# Altium footprint library PcbLib1.PcbLib: 136 footprints (part 8 of 9)
Each footprint in its own frame and in the unit in brackets; x right, y up, seen from the top. Pads: shape width x height; smd on the part's side, far side on the other; paste and mask are expansions set on the pad; w line width, h text height; cw(c..) or ccw(c..) is an arc to the next point about the centre after c.
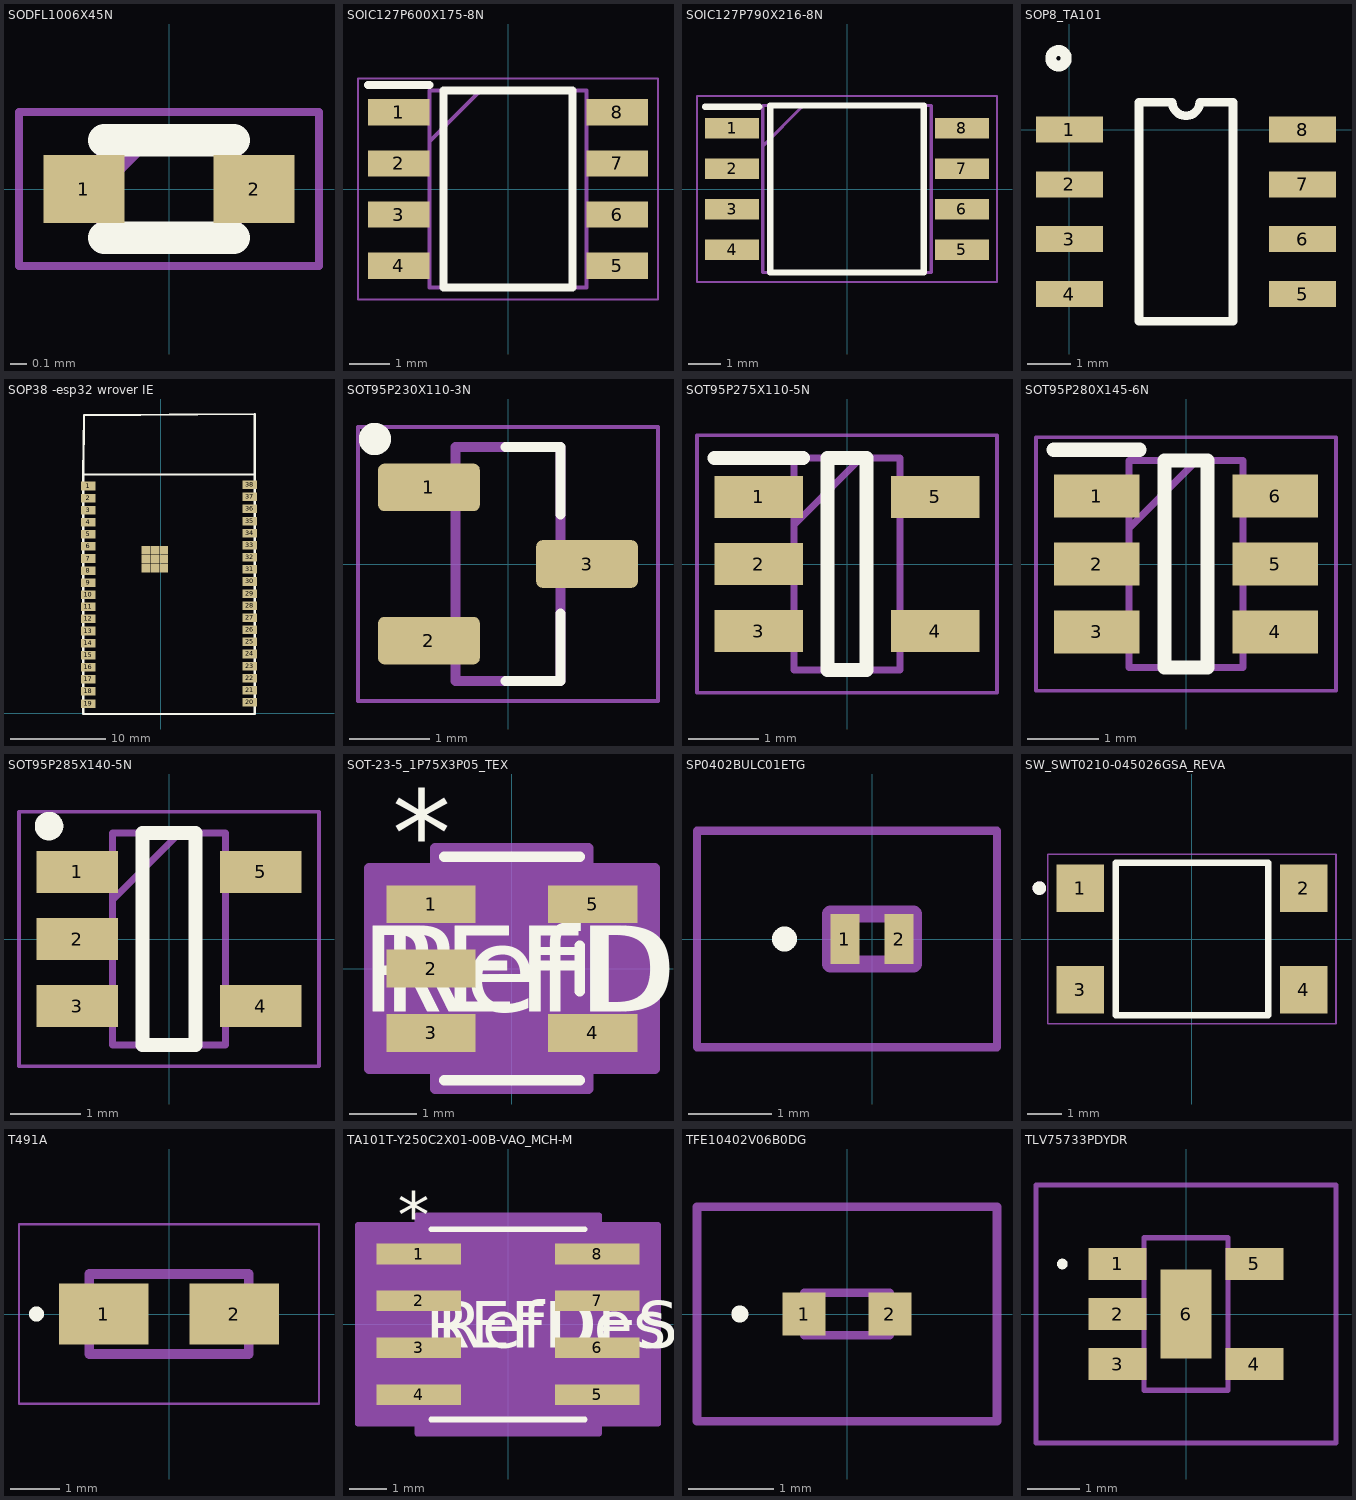
[diagram p7: the footprints below, top view; thin cyan lines are the x and y axes]

## SODFL1006X45N [mm]
pads (2):
  rect 0.5x0.42 smd: 1(-0.525,0) 2(0.525,0)
Top Overlay:
  lines w0.2: -0.4,-0.3 0.4,-0.3 ; -0.4,0.3 0.4,0.3
Mechanical 13:
  lines w0.1: -0.4,0.05 -0.15,0.3 ; -0.4,-0.3 -0.4,0.3 0.4,0.3 0.4,-0.3 -0.4,-0.3
Mechanical 15:
  lines w0.05: -0.925,-0.475 -0.925,0.475 0.925,0.475 0.925,-0.475 -0.925,-0.475
3D body "DF2S5.6FS,L3M.stp": height 0.4, standoff 0, extent -0.5,-0.3 0.5,0.3

## SOIC127P600X175-8N [mm]
pads (8):
  rect 1.525x0.65 smd: 1(-2.712,1.905) 2(-2.712,0.635) 3(-2.712,-0.635) 4(-2.712,-1.905) 5(2.712,-1.905) 6(2.712,-0.635) 7(2.712,0.635) 8(2.712,1.905)
Top Overlay:
  lines w0.2: -3.475,2.58 -1.95,2.58 ; -1.6,-2.45 -1.6,2.45 1.6,2.45 1.6,-2.45 -1.6,-2.45
Mechanical 13:
  lines w0.1: -1.95,1.18 -0.68,2.45 ; -1.95,-2.45 -1.95,2.45 1.95,2.45 1.95,-2.45 -1.95,-2.45
Mechanical 15:
  lines w0.05: -3.725,-2.75 -3.725,2.75 3.725,2.75 3.725,-2.75 -3.725,-2.75
3D body "NE555DR.stp": height 1.75, standoff 0, extent -3,-2.45 3,2.45

## SOIC127P790X216-8N [mm]
pads (8):
  rect 1.7x0.65 smd: 1(-3.6,1.905) 2(-3.6,0.635) 3(-3.6,-0.635) 4(-3.6,-1.905) 5(3.6,-1.905) 6(3.6,-0.635) 7(3.6,0.635) 8(3.6,1.905)
Top Overlay:
  lines w0.2: -4.45,2.58 -2.75,2.58 ; -2.4,-2.615 2.4,-2.615 2.4,2.615 -2.4,2.615 -2.4,-2.615
Mechanical 13:
  lines w0.1: -2.64,1.345 -1.37,2.615 ; -2.64,-2.615 2.64,-2.615 2.64,2.615 -2.64,2.615 -2.64,-2.615
Mechanical 15:
  lines w0.05: -4.7,-2.915 4.7,-2.915 4.7,2.915 -4.7,2.915 -4.7,-2.915
3D body "GD25Q128ESIGR.stp": height 2.16, standoff 0, extent -3.95,-2.615 3.95,2.615

## SOP8_TA101 [mm]
pads (8):
  rect 1.55x0.6 smd: 1(0,0) 2(0,-1.27) 3(0,-2.54) 4(0,-3.81) 5(5.4,-3.81) 6(5.4,-2.54) 7(5.4,-1.27) 8(5.4,0)
Top Overlay:
  circle w0.254: c-0.254,1.651 r0.18
  lines w0.2: 1.61,-4.445 1.61,0.635 2.382,0.635 ccw(c2.7,0.635) 3.017,0.635 3.79,0.635 3.79,-4.445 1.61,-4.445

## SOP38 -esp32 wrover IE [mm]
pads (47):
  rect 1.5x0.9 smd: 1(-7.62,23.876) 2(-7.62,22.606) 3(-7.62,21.336) 4(-7.62,20.066) 5(-7.62,18.796) 6(-7.62,17.526) 7(-7.62,16.256) 8(-7.62,14.986) 9(-7.62,13.716) 10(-7.62,12.446) 11(-7.62,11.176) 12(-7.62,9.906) 13(-7.62,8.636) 14(-7.62,7.366) 15(-7.62,6.096) 16(-7.62,4.826) 17(-7.62,3.556) 18(-7.62,2.286) 19(-7.62,1.016) 20(9.38,1.143) 21(9.38,2.413) 22(9.38,3.683) 23(9.38,4.953) 24(9.38,6.223) 25(9.372,7.493) 26(9.38,8.763) 27(9.38,10.033) 28(9.38,11.303) 29(9.38,12.573) 30(9.38,13.843) 31(9.38,15.113) 32(9.38,16.383) 33(9.38,17.653) 34(9.38,18.923) 35(9.38,20.193) 36(9.38,21.463) 37(9.38,22.733) 38(9.38,24.003)
  rect 0.9x0.9 smd: 38(-1.578,15.21) 38(-1.578,16.16) 38(-1.578,17.11) 38(-0.628,15.21) 38(-0.628,16.16) 38(-0.628,17.11) 38(0.322,15.21) 38(0.322,16.16) 38(0.322,17.11)
Top Overlay:
  lines w0.2: -8.12,-0.084 9.88,-0.084 ; -8.12,25.073 0.756,25.073 9.837,25.073
  lines w0.254: -8.12,-0.084 -8.12,1.016 -8.12,25.073 -8.054,31.316 9.88,31.443 9.88,1.143 9.88,-0.084
3D body "ESP32-WROVER-E-N4R8--3DModel-STEP-56544.STEP": height 3.45, standoff 0, extent -7.985,0.064 10.015,31.463

## SOT95P230X110-3N [mm]
pads (3):
  rrect25% 1.26x0.59 smd: 1(-0.98,0.95) 2(-0.98,-0.95) 3(0.98,0)
Top Overlay:
  circle w0.2: c-1.65,1.55 r0.1
  lines w0.127: -0.03,-1.45 0.65,-1.45 0.65,-0.615 ; -0.03,1.45 0.65,1.45 0.65,0.615
Mechanical 13:
  lines w0.127: -0.65,-1.45 -0.65,1.45 0.65,1.45 0.65,-1.45 -0.65,-1.45
Mechanical 15:
  lines w0.05: -1.86,-1.7 1.86,-1.7 1.86,1.7 -1.86,1.7 -1.86,-1.7
3D body "step_temp.STEP": height 1.1, standoff 0, extent -1.15,-1.45 1.15,1.45

## SOT95P275X110-5N [mm]
pads (5):
  rect 1.25x0.6 smd: 1(-1.25,0.95) 2(-1.25,0) 3(-1.25,-0.95) 4(1.25,-0.95) 5(1.25,0.95)
Top Overlay:
  lines w0.2: -1.875,1.5 -0.625,1.5 ; -0.275,-1.5 0.275,-1.5 0.275,1.5 -0.275,1.5 -0.275,-1.5
Top Courtyard:
  lines w0.05: -2.125,-1.825 2.125,-1.825 2.125,1.825 -2.125,1.825 -2.125,-1.825
Top 3D Body:
  lines w0.1: -0.75,0.55 0.2,1.5 ; -0.75,-1.5 0.75,-1.5 0.75,1.5 -0.75,1.5 -0.75,-1.5
3D body "NCV8114ASN180T1G.stp": height 1.1, standoff 0, extent -1.375,-1.5 1.375,1.5

## SOT95P280X145-6N [mm]
pads (6):
  rect 1.2x0.6 smd: 1(-1.25,0.95) 2(-1.25,0) 3(-1.25,-0.95) 4(1.25,-0.95) 5(1.25,0) 6(1.25,0.95)
Top Overlay:
  lines w0.2: -1.85,1.6 -0.65,1.6 ; -0.3,-1.45 0.3,-1.45 0.3,1.45 -0.3,1.45 -0.3,-1.45
Mechanical 13:
  lines w0.1: -0.8,0.5 0.15,1.45 ; -0.8,-1.45 0.8,-1.45 0.8,1.45 -0.8,1.45 -0.8,-1.45
Mechanical 15:
  lines w0.05: -2.1,-1.775 2.1,-1.775 2.1,1.775 -2.1,1.775 -2.1,-1.775
3D body "TLV61070ADBVR.stp": height 1.2, standoff 0, extent -1.4,-1.45 1.4,1.45

## SOT95P285X140-5N [mm]
pads (5):
  rect 1.15x0.6 smd: 1(-1.3,0.95) 2(-1.3,0) 3(-1.3,-0.95) 4(1.3,-0.95) 5(1.3,0.95)
Top Overlay:
  circle w0.254: c-1.7,1.6 r0.075
  lines w0.2: -0.375,-1.5 -0.375,1.5 0.375,1.5 0.375,-1.5 -0.375,-1.5
Top Courtyard:
  lines w0.05: -2.125,-1.8 -2.125,1.8 2.125,1.8 2.125,-1.8 -2.125,-1.8
Top 3D Body:
  lines w0.1: -0.8,0.55 0.15,1.5 ; -0.8,-1.5 -0.8,1.5 0.8,1.5 0.8,-1.5 -0.8,-1.5
3D body "AP7375-50W5-7.stp": height 1.4, standoff 0, extent -1.425,-1.5 1.425,1.5

## SOT-23-5_1P75X3P05_TEX [mil]
pads (5):
  rect 52x22 smd paste+0 mask+0: 1(-47,37.4) 2(-47,0) 3(-47,-37.4) 4(47,-37.4) 5(47,37.4)
Top Overlay:
  lines w6: -39.5,-65 39.5,-65 ; -39.5,65 39.5,65 ; 39.5,-13.3 39.5,13.3
  text "RefDes" at -75,-25 h50
  text "*" at -69.5,54.4 h50
  text "REFDES" at -87.5,-25 h50
Top Courtyard:
  region: -44.5,-58.4 -83,-58.4 -83,58.4 -44.5,58.4 -44.5,70 44.5,70 44.5,58.4 83,58.4 83,-58.4 44.5,-58.4 44.5,-70 -44.5,-70
  lines w6: -83,-58.4 -44.5,-58.4 -44.5,-70 44.5,-70 44.5,-58.4 83,-58.4 83,58.4 44.5,58.4 44.5,70 -44.5,70 -44.5,58.4 -83,58.4 -83,-58.4
Top 3D Body:
  lines w0: -12,60 ccw(c0,60) 12,60
  lines w1: -59,-47.4 -34.5,-47.4 -34.5,-27.4 -59,-27.4 -59,-47.4 ; -59,-10 -34.5,-10 -34.5,10 -59,10 -59,-10 ; -59,27.4 -34.5,27.4 -34.5,47.4 -59,47.4 -59,27.4 ; -34.5,-60 -34.5,60 34.5,60 34.5,-60 -34.5,-60 ; 34.5,-47.4 59,-47.4 59,-27.4 34.5,-27.4 34.5,-47.4 ; 34.5,27.4 59,27.4 59,47.4 34.5,47.4 34.5,27.4
  text "RefDes2" at -87.5,-25 h50
  text "*" at -32,7 h50
3D body "SOT-23-5_1P75X3P05_TEX.step": height 57.09, standoff 0, extent -59.02,-60 59.02,60

## SP0402BULC01ETG [mm]
pads (2):
  rect 0.35x0.6 smd: 1(-0.325,0) 2(0.325,0)
Top Overlay:
  lines w0.2: -1.1,0 ccw(c-1.05,0) -1,0 ; -1.1,0 cw(c-1.05,0) -1,0 ; -1.1,0 ccw(c-1.05,0) -1,0
Mechanical 13:
  lines w0.2: -0.5,-0.3 0.5,-0.3 0.5,0.3 -0.5,0.3 -0.5,-0.3
Mechanical 15:
  lines w0.1: -2.1,-1.3 1.5,-1.3 1.5,1.3 -2.1,1.3 -2.1,-1.3
3D body "SP0402B-ULC-01ETG.stp": height 0.54, standoff -0.02, extent -0.521,-0.33 0.521,0.33

## SW_SWT0210-045026GSA_REVA [mm]
height 4.6
pads (4):
  rect 1.4x1.4 smd: 1(-3.3,1.5) 2(3.3,1.5) 3(-3.3,-1.5) 4(3.3,-1.5)
Top Overlay:
  circle w0.2: c-4.5,1.5 r0.1
  lines w0.2: -2.25,-2.25 2.25,-2.25 2.25,2.25 -2.25,2.25 -2.25,-2.25
Mechanical 13:
  circle w0.2: c-4.5,1.5 r0.1
  lines w0.1: -2.25,-2.25 2.25,-2.25 2.25,2.25 -2.25,2.25 -2.25,-2.25
Mechanical 15:
  lines w0.05: -4.25,-2.5 4.25,-2.5 4.25,2.5 -4.25,2.5 -4.25,-2.5

## T491A [mm]
pads (2):
  rect 1.8x1.23 smd: 1(-1.31,0) 2(1.31,0)
Top Overlay:
  circle w0.2: c-2.66,0 r0.05
Top Courtyard:
  lines w0.05: -3.01,-1.8 3.01,-1.8 3.01,1.8 -3.01,1.8 -3.01,-1.8
Top 3D Body:
  lines w0.2: -1.6,-0.8 1.6,-0.8 1.6,0.8 -1.6,0.8 -1.6,-0.8
3D body "T491A106K006AT7280.stp": height 1.81, standoff 0, extent -1.7,-0.9 1.7,0.9

## TA101T-Y250C2X01-00B-VAO_MCH-M [mil]
pads (8):
  rect 90x22 smd paste+0 mask+0: 1(-95,75) 2(-95,25) 3(-95,-25) 4(-95,-75) 5(95,-75) 6(95,-25) 7(95,25) 8(95,75)
Top Overlay:
  lines w6: -82,-101.5 82,-101.5 ; -82,101.5 82,101.5
  text "REFDES" at -87.5,-25 h50
  text "*" at -117.5,92 h50
  text "RefDes" at -75,-25 h50
Mechanical 13:
  lines w0: -12,96.5 ccw(c0,96.5) 12,96.5
  lines w1: -118,-85 -118,-65 -77,-65 -77,-85 -118,-85 ; -118,-35 -118,-15 -77,-15 -77,-35 -118,-35 ; -118,15 -118,35 -77,35 -77,15 -118,15 ; -118,65 -118,85 -77,85 -77,65 -118,65 ; -77,-96.5 77,-96.5 77,96.5 -77,96.5 -77,-96.5 ; 77,-85 77,-65 118,-65 118,-85 77,-85 ; 77,-35 77,-15 118,-15 118,-35 77,-35 ; 77,15 77,35 118,35 118,15 77,15 ; 77,65 77,85 118,85 118,65 77,65
  text "*" at -74.5,43.5 h50
  text "RefDes2" at -87.5,-25 h50
Mechanical 15:
  region: -97,-106 -160,-106 -160,106 -97,106 -97,116.5 97,116.5 97,106 160,106 160,-106 97,-106 97,-116.5 -97,-116.5
  lines w6: -160,-106 -160,106 -97,106 -97,116.5 97,116.5 97,106 160,106 160,-106 97,-106 97,-116.5 -97,-116.5 -97,-106 -160,-106
3D body "SOP_TA101T-Y250C2X01-00B-VAO_MCH.step": height 69.09, standoff 0, extent -117.99,-96.5 117.99,96.5

## TFE10402V06B0DG [mm]
pads (2):
  rect 0.5x0.5 smd: 1(-0.5,0) 2(0.5,0)
Top Overlay:
  lines w0.1: -1.3,0 ccw(c-1.25,0) -1.2,0 ccw(c-1.25,0) -1.3,0
Mechanical 13:
  lines w0.1: -0.5,-0.25 -0.5,0.25 0.5,0.25 0.5,-0.25 -0.5,-0.25
Mechanical 15:
  lines w0.1: -1.75,-1.25 -1.75,1.25 1.75,1.25 1.75,-1.25 -1.75,-1.25
3D body "TFE10402V06B0DG.stp": height 0.56, standoff 0, extent -0.7,-0.25 0.7,0.25

## TLV75733PDYDR [mm]
pads (6):
  rect 1.1x0.6 smd: 1(-1.3,0.95) 2(-1.3,0) 3(-1.3,-0.95) 4(1.3,-0.95) 5(1.3,0.95)
  rect 0.975x1.7 smd: 6(0,0)
Top Overlay:
  lines w0.1: -2.4,0.95 ccw(c-2.35,0.95) -2.3,0.95 ccw(c-2.35,0.95) -2.4,0.95
Mechanical 13:
  lines w0.1: -0.8,-1.45 -0.8,1.45 0.8,1.45 0.8,-1.45 -0.8,-1.45
Mechanical 15:
  lines w0.1: -2.85,-2.45 -2.85,2.45 2.85,2.45 2.85,-2.45 -2.85,-2.45
3D body "TLV75733PDYDR.stp": height 1.25, standoff 0, extent -1.531,-1.375 1.531,1.375